# Altium footprint library PcbLib_jp.PcbLib: 255 footprints (part 2 of 16)
Each footprint in its own frame and in the unit in brackets; x right, y up, seen from the top. Pads: shape width x height; smd on the part's side, far side on the other; paste and mask are expansions set on the pad; w line width, h text height; cw(c..) or ccw(c..) is an arc to the next point about the centre after c.
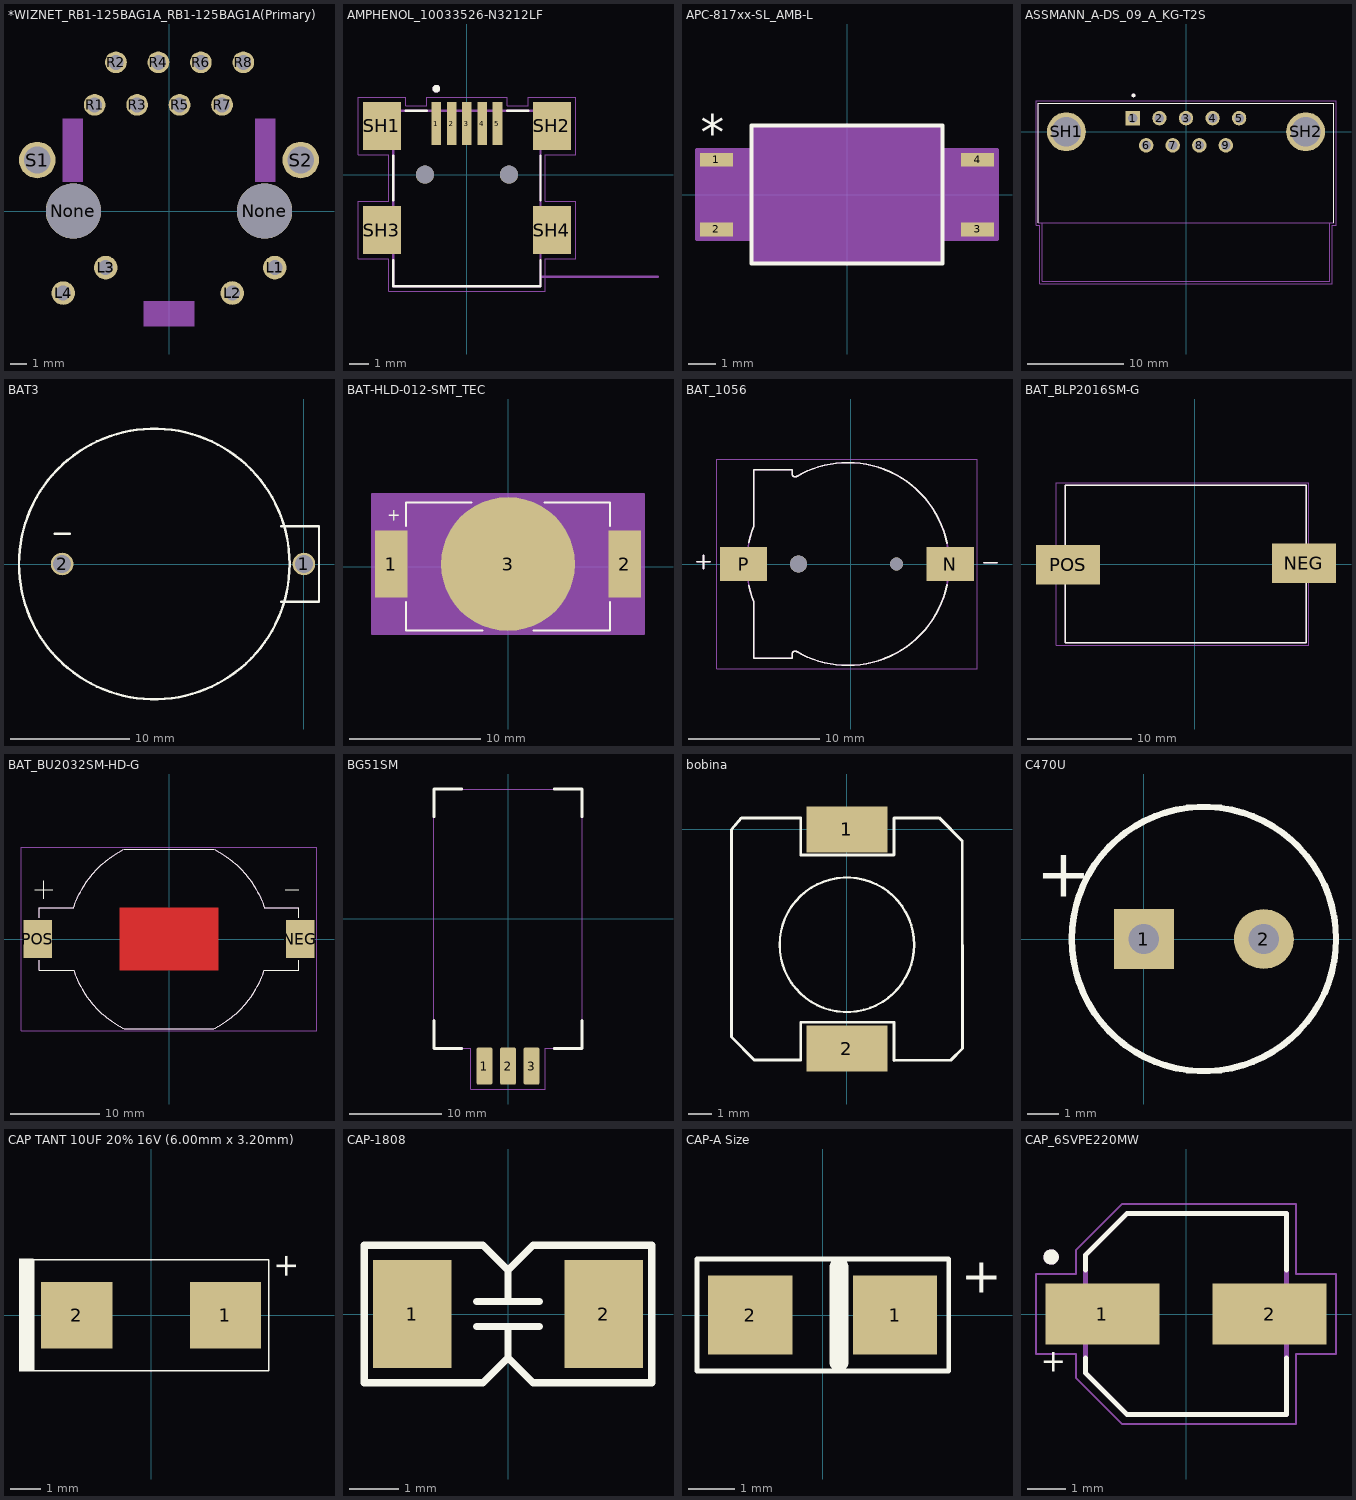
[diagram p1: the footprints below, top view; thin cyan lines are the x and y axes]

## *WIZNET_RB1-125BAG1A_RB1-125BAG1A(Primary) [mm]
pads (16):
  round 1.408 hole 0.9: L1(6.325,-3.38) L2(3.784,-4.899) L3(-3.786,-3.379) L4(-6.325,-4.9)
  round 3.3 hole 3.3 unplated: None(-5.716,-0.001) None(5.714,-0.001)
  round 1.3 hole 0.9: R1(-4.446,6.349) R2(-3.176,8.889) R3(-1.906,6.349) R4(-0.636,8.889) R5(0.634,6.349) R6(1.904,8.889) R7(3.174,6.349) R8(4.444,8.889)
  round 2.184 hole 1.6: S1(-7.876,3.049) S2(7.874,3.049)
Mechanical 13:
  region: -6.36,5.528 -5.15,5.528 -5.15,1.756 -6.36,1.756
  region: 5.156,5.528 6.348,5.528 6.348,1.756 5.156,1.756
  region: -1.5,-5.4 1.5,-5.4 1.5,-6.9 -1.5,-6.9
  region: -6.36,5.528 -5.15,5.528 -5.15,1.756 -6.36,1.756
  region: 5.156,5.528 6.348,5.528 6.348,1.756 5.156,1.756
  region: -1.5,-5.4 1.5,-5.4 1.5,-6.9 -1.5,-6.9

## AMPHENOL_10033526-N3212LF [mm]
height 3.95
pads (11):
  rect 0.5x2.25 smd: 1(-1.6,2.675) 2(-0.8,2.675) 3(0,2.675) 4(0.8,2.675) 5(1.6,2.675)
  rect 2x2.5 smd: SH1(-4.45,2.55) SH2(4.45,2.55) SH3(-4.45,-2.9) SH4(4.45,-2.9)
  round 0.95 hole 0.95 unplated: ""(-2.2,0) ""(2.2,0)
Top Overlay:
  circle w0.2: c-1.6,4.5 r0.1
  lines w0.127: -3.85,-4.47 -3.85,-5.85 3.85,-5.85 3.85,-4.47 ; -3.85,-1.33 -3.85,0.98 ; -3.21,3.35 -2.1,3.35 ; 2.1,3.35 3.21,3.35 ; 3.85,-1.33 3.85,0.98
Mechanical 13:
  circle w0.2: c-1.6,4.5 r0.1
  lines w0.127: 10,-5.34 3.85,-5.34 ; 3.85,-5.34 3.85,-5.85 -3.85,-5.85 -3.85,3.35 3.85,3.35 3.85,-5.34
  text "PCB EDGE" at 4.254,-6.347 h0.8
Mechanical 15:
  lines w0.05: -5.7,-4.4 -5.7,-1.4 -4.1,-1.4 -4.1,1.05 -5.7,1.05 -5.7,4.05 -3.2,4.05 -3.2,3.6 -2.1,3.6 -2.1,4.05 2.1,4.05 2.1,3.6 3.2,3.6 3.2,4.05 5.7,4.05 5.7,1.05 4.1,1.05 4.1,-1.4 5.7,-1.4 5.7,-4.4 4.1,-4.4 4.1,-6.1 -4.1,-6.1 -4.1,-4.4 -5.7,-4.4
3D body "step_temp.STEP": height 3.95, standoff -1.05, extent -4.95,-5.85 4.95,3.47

## APC-817xx-SL_AMB-L [mil]
pads (4):
  rect 48x20 smd paste+0 mask+0: 1(-187.5,50) 2(-187.5,-50) 3(187.5,-50) 4(187.5,50)
Top Overlay:
  lines w6: -137,-99 -137,99 137,99 137,-99 -137,-99
  text "*" at -210,65 h50
Mechanical 13:
  lines w0: -12,94 ccw(c0,94) 12,94
  lines w1: -205.5,-60 -132,-60 -132,-40 -205.5,-40 -205.5,-60 ; -205.5,40 -132,40 -132,60 -205.5,60 -205.5,40 ; -132,-94 -132,94 132,94 132,-94 -132,-94 ; 132,-60 205.5,-60 205.5,-40 132,-40 132,-60 ; 132,40 205.5,40 205.5,60 132,60 132,40
  text "*" at -129.5,41 h50
Mechanical 15:
  region: -136,-64 -215.5,-64 -215.5,64 -136,64 -136,98 136,98 136,64 215.5,64 215.5,-64 136,-64 136,-98 -136,-98
  lines w6: -215.5,-64 -136,-64 -136,-98 136,-98 136,-64 215.5,-64 215.5,64 136,64 136,98 -136,98 -136,64 -215.5,64 -215.5,-64
3D body "APC-817xx-SL_AMB.step": height 150.12, standoff 0, extent -205.51,-94.02 205.51,94.02

## ASSMANN_A-DS_09_A_KG-T2S [mm]
height 12.8
pads (11):
  rect 1.508x1.508 / inner round 1.508 / far side rect 1.508x1.508 hole 1: 1(-5.54,1.42)
  round 1.508 hole 1: 2(-2.77,1.42) 3(0,1.42) 4(2.77,1.42) 5(5.54,1.42) 6(-4.155,-1.42) 7(-1.385,-1.42) 8(1.385,-1.42) 9(4.155,-1.42)
  round 4.066 hole 3.05: SH1(-12.495,0) SH2(12.495,0)
Top Overlay:
  circle w0.2: c-5.48,3.8 r0.1
  lines w0.127: -15.405,-9.5 -15.405,3 15.405,3 15.405,-9.5
Mechanical 13:
  circle w0.2: c-5.48,3.8 r0.1
  lines w0.127: -15,-9.5 -15.405,-9.5 -15.405,3 15.405,3 15.405,-9.5 15,-9.5 ; -15,-9.5 -15,-15.6 15,-15.6 15,-9.5 ; -15,-9.5 15,-9.5
Mechanical 15:
  lines w0.05: -15.655,-9.75 -15.655,3.25 15.655,3.25 15.655,-9.75 15.25,-9.75 15.25,-15.85 -15.25,-15.85 -15.25,-9.75 -15.655,-9.75
3D body "step_temp.STEP": height 12.8, standoff -4.4, extent -15.405,-15.55 15.405,3.05

## BAT3 [mil]
pads (2):
  round 75 / inner round 60 / far side round 75 hole 60 mask+15: 1(0,0) 2(-800,0)
Top Overlay:
  circle w8: c-495,0 r447.8
  lines w8: -825,100 -775,100 ; -75,-125 50,-125 50,125 -75,125
3D body "User Library-20mm_coin_holder.STEP": height 400.39, standoff -78.74, extent -981.75,-451.75 98.22,453.76

## BAT-HLD-012-SMT_TEC [mil]
pads (3):
  rect 98x201 smd paste+0 mask+0: 1(-350.39,7.87) 2(350.39,7.87)
  round 402 smd paste-201 mask-201: 3(0,7.87)
Top Overlay:
  lines w6: -306,-105.73 -306,-192 -76.76,-192 ; -306,121.47 -306,192 -109.24,192 ; 76.76,-192 306,-192 306,-105.73 ; 109.24,192 306,192 306,121.47
  text "+" at -362.99,138.19 h35.43
Mechanical 13:
  circle w20: c-350.39,82.87 r15
  lines w1: -301,-187 301,-187 301,187 -301,187 -301,-187
Mechanical 15:
  region: 409.39,218.87 -409.39,218.87 -409.39,-203.13 409.39,-203.13
  lines w6: -409.39,-203.13 -409.39,218.87 409.39,218.87 409.39,-203.13 -409.39,-203.13
3D body "BAT-HLD-012-SMT.step": height 140, standoff 0, extent -300,-185 300,185

## BAT_1056 [mm]
height 3.99
pads (4):
  rect 3.6x2.6 smd: N(7.61,0) P(-8.18,0)
  round 1.3 hole 1.3 unplated: ""(-3.98,0)
  round 1 hole 1 unplated: ""(3.51,0)
Top Overlay:
  lines w0.127: -11.735,0.16 -10.735,0.16 ; -11.235,-0.34 -11.235,0.66 ; -7.78,-1.632 ccw(c-0.484,-0.082) -7.4,-2.876 ; -7.78,1.632 cw(c-0.484,0.082) -7.4,2.876 ; -7.41,-2.85 -7.41,-7.2 -4.46,-7.2 -4.46,-6.88 ; -7.41,2.85 -7.41,7.2 -4.46,7.2 -4.46,6.88 ; -4.46,-6.881 cw(c-4.255,-6.87) -4.266,-6.665 cw(c-4.248,-7.014) -4.084,-6.705 ; -4.46,6.881 ccw(c-4.255,6.87) -4.266,6.665 ccw(c-4.248,7.014) -4.084,6.705 ; -4.078,-6.709 ccw(c-0.212,-0.013) -0.212,-7.745 ; -4.078,6.709 cw(c-0.212,0.013) -0.212,7.745 ; -0.21,-7.745 ccw(c-0.21,0) 7.366,-1.61 ; -0.21,7.745 cw(c-0.21,0) 7.366,1.61 ; 10.185,0.09 11.185,0.09
Mechanical 13:
  lines w0.127: -11.735,0.16 -10.735,0.16 ; -11.235,-0.34 -11.235,0.66 ; -7.41,-2.85 -7.41,-7.2 -4.46,-7.2 -4.46,-6.88 ; -7.41,2.85 -7.41,7.2 -4.46,7.2 -4.46,6.88 ; -7.393,-2.893 cw(c-0.231,0) -7.393,2.893 ; -4.46,-6.881 cw(c-4.255,-6.87) -4.266,-6.665 cw(c-4.248,-7.014) -4.084,-6.705 ; -4.46,6.881 ccw(c-4.255,6.87) -4.266,6.665 ccw(c-4.248,7.014) -4.084,6.705 ; -4.078,-6.709 ccw(c-0.212,-0.013) -0.212,-7.745 ; -4.078,6.709 cw(c-0.212,0.013) -0.212,7.745 ; -0.21,-7.745 ccw(c-0.21,0) -0.21,7.745 ; 10.185,0.09 11.185,0.09
Mechanical 15:
  lines w0.05: -10.23,-8 -10.23,8 9.66,8 9.66,-8 -10.23,-8
3D body "step_temp.STEP": height 4.33, standoff -0.83, extent -9.478,-7.631 9.322,7.507

## BAT_BLP2016SM-G [mm]
pads (2):
  rect 6.16x3.79 smd: NEG(10.45,0.09) POS(-12.17,-0.06)
Top Overlay:
  lines w0.127: -12.45,-1.8 -12.45,-7.55 10.67,-7.55 10.67,-1.8 ; -12.45,1.8 -12.45,7.55 10.67,7.55 10.67,1.8
  text "-" at 11.43,0 h1.27
  text "+" at -15.24,0 h1.27
Mechanical 13:
  lines w0.127: -12.45,-7.55 10.67,-7.55 10.67,7.55 -12.45,7.55 -12.45,-7.55
  text "-" at 11.43,0 h1.27
  text "+" at -15.24,0 h1.27
Mechanical 15:
  lines w0.05: -13.33,-7.8 -13.33,7.8 10.92,7.8 10.92,-7.8 -13.33,-7.8
3D body "BAT-HLD-010-SMT-TR--3DModel-STEP-56544.STEP": height 5.5, standoff 0, extent -14.4,-8 12.6,8

## BAT_BU2032SM-HD-G [mm]
pads (2):
  rect 3.2x4.2 smd: NEG(14.65,0) POS(-14.65,0)
Top Layer:
  region: 5.5,-3.5 -5.5,-3.5 -5.5,3.5 5.5,3.5
Top Overlay:
  lines w0.127: -15,5.5 -13,5.5 ; -14.5,-2.4 -14.5,-3.5 -10.645,-3.5 -10.581,-3.681 -10.458,-4.024 -10.35,-4.287 -10.242,-4.538 -10.058,-4.937 -9.88,-5.282 -9.7,-5.594 -9.524,-5.892 -9.168,-6.436 -8.897,-6.809 -8.516,-7.277 -8.022,-7.82 -7.774,-8.061 -7.55,-8.273 -7.354,-8.447 -7.193,-8.586 -7,-8.746 -6.779,-8.919 -6.628,-9.03 -6.375,-9.211 -6.049,-9.433 -5.741,-9.619 -5.497,-9.758 -5.166,-9.939 -5.013,-10 ; -14.5,2.4 -14.5,3.5 -10.645,3.5 -10.581,3.681 -10.458,4.024 -10.35,4.287 -10.242,4.538 -10.058,4.937 -9.88,5.282 -9.7,5.594 -9.524,5.892 -9.168,6.436 -8.897,6.809 -8.516,7.277 -8.022,7.82 -7.774,8.061 -7.55,8.273 -7.354,8.447 -7.193,8.586 -7,8.746 -6.779,8.919 -6.628,9.03 -6.375,9.211 -6.049,9.433 -5.741,9.619 -5.497,9.758 -5.166,9.939 -5.013,10 ; -14,4.5 -14,6.5 ; -5,-10 5,-10 ; -5,10 5,10 ; 5.013,-10 5.166,-9.939 5.497,-9.758 5.741,-9.619 6.049,-9.433 6.375,-9.211 6.628,-9.03 6.779,-8.919 7,-8.746 7.193,-8.586 7.354,-8.447 7.55,-8.273 7.774,-8.061 8.022,-7.82 8.516,-7.277 8.897,-6.809 9.168,-6.436 9.524,-5.892 9.7,-5.594 9.88,-5.282 10.058,-4.937 10.242,-4.538 10.35,-4.287 10.458,-4.024 10.581,-3.681 10.645,-3.5 14.5,-3.5 14.5,-2.4 ; 5.013,10 5.166,9.939 5.497,9.758 5.741,9.619 6.049,9.433 6.375,9.211 6.628,9.03 6.779,8.919 7,8.746 7.193,8.586 7.354,8.447 7.55,8.273 7.774,8.061 8.022,7.82 8.516,7.277 8.897,6.809 9.168,6.436 9.524,5.892 9.7,5.594 9.88,5.282 10.058,4.937 10.242,4.538 10.35,4.287 10.458,4.024 10.581,3.681 10.645,3.5 14.5,3.5 14.5,2.4 ; 13,5.5 14.5,5.5
Top Solder:
  region: 5.6,-3.6 -5.6,-3.6 -5.6,3.6 5.6,3.6
Mechanical 13:
  lines w0.127: -14.5,-2.4 -14.5,-3.5 -10.645,-3.5 -10.581,-3.681 -10.458,-4.024 -10.35,-4.287 -10.242,-4.538 -10.058,-4.937 -9.88,-5.282 -9.7,-5.594 -9.524,-5.892 -9.168,-6.436 -8.897,-6.809 -8.516,-7.277 -8.022,-7.82 -7.774,-8.061 -7.55,-8.273 -7.354,-8.447 -7.193,-8.586 -7,-8.746 -6.779,-8.919 -6.628,-9.03 -6.375,-9.211 -6.049,-9.433 -5.741,-9.619 -5.497,-9.758 -5.166,-9.939 -5.013,-10 ; -14.5,2.4 -14.5,3.5 -10.645,3.5 -10.581,3.681 -10.458,4.024 -10.35,4.287 -10.242,4.538 -10.058,4.937 -9.88,5.282 -9.7,5.594 -9.524,5.892 -9.168,6.436 -8.897,6.809 -8.516,7.277 -8.022,7.82 -7.774,8.061 -7.55,8.273 -7.354,8.447 -7.193,8.586 -7,8.746 -6.779,8.919 -6.628,9.03 -6.375,9.211 -6.049,9.433 -5.741,9.619 -5.497,9.758 -5.166,9.939 -5.013,10 ; -5,-10 5,-10 ; -5,10 5,10 ; 5.013,-10 5.166,-9.939 5.497,-9.758 5.741,-9.619 6.049,-9.433 6.375,-9.211 6.628,-9.03 6.779,-8.919 7,-8.746 7.193,-8.586 7.354,-8.447 7.55,-8.273 7.774,-8.061 8.022,-7.82 8.516,-7.277 8.897,-6.809 9.168,-6.436 9.524,-5.892 9.7,-5.594 9.88,-5.282 10.058,-4.937 10.242,-4.538 10.35,-4.287 10.458,-4.024 10.581,-3.681 10.645,-3.5 14.5,-3.5 14.5,-2.4 ; 5.013,10 5.166,9.939 5.497,9.758 5.741,9.619 6.049,9.433 6.375,9.211 6.628,9.03 6.779,8.919 7,8.746 7.193,8.586 7.354,8.447 7.55,8.273 7.774,8.061 8.022,7.82 8.516,7.277 8.897,6.809 9.168,6.436 9.524,5.892 9.7,5.594 9.88,5.282 10.058,4.937 10.242,4.538 10.35,4.287 10.458,4.024 10.581,3.681 10.645,3.5 14.5,3.5 14.5,2.4
Mechanical 15:
  lines w0.05: -16.5,-10.25 16.5,-10.25 16.5,10.25 -16.5,10.25 -16.5,-10.25
3D body "BU2032SM-HD-G--3DModel-STEP-1.STEP": height 5.3, standoff 0, extent -15.99,-10.07 16.01,9.93

## BG51SM [mm] "Nuclear Beta and Gamma Radiation Sensor"
height 7
pads (3):
  rrect20% 1.7x4 smd: 1(-2.54,-15.9) 2(0,-15.9) 3(2.54,-15.9)
Top Overlay:
  lines w0.305: -8,-11 -8,-14 -5,-14 ; -8,11 -8,14 -5,14 ; 5,-14 8,-14 8,-11 ; 5,14 8,14 8,11
Mechanical 15:
  lines w0.051: -8,-14 -8,14 8,14 8,-14 5,-14 4,-14 4,-18.375 -4,-18.375 -4,-14 -5,-14 -8,-14
3D body "BG51.stp": height 7, standoff 0, extent -8,-17.5 8,14

## bobina [mil]
pads (2):
  rect 137.8x78.73 smd: 1(0,0) 2(0,-374)
Top Overlay:
  circle w3.93: c0,-196.85 r114.77
  lines w5: -196.83,-354.32 -196.83,0 -180,19.67 -78.73,19.67 -78.73,-44 80,-44 80,19.67 157.47,19.67 196.83,-19.7 197.15,-373.68 177.15,-393.68 80,-394 80,-329 -78.73,-329 -78.73,-393.68 -157.47,-393.68 -196.83,-354.32
3D body "Coilcraft-MSS1038.STEP": height 212.6, standoff 55.12, extent -197.79,-390.75 203.79,14.76

## C470U [mil]
pads (2):
  rect 75x75 / inner round 75 / far side round 75 hole 38: 1(0,0)
  round 75 / inner round 60 / far side round 75 hole 38: 2(150,0)
Top Overlay:
  circle w8: c75,0 r165.3
  text "+" at -135,53 h60
3D body "CircuitWorks-ELECTROLITIC CAPACITOR RADIAL 8X12.STEP": height 476.38, standoff -94.49, extent -82.48,-157.47 232.49,157.49

## CAP TANT 10UF 20% 16V (6.00mm x 3.20mm) [mm]
pads (2):
  rect 2.37x2.21 smd: 1(2.475,0) 2(-2.475,0)
Top Overlay:
  rectangle: -4.394,-1.88 -3.91,1.88
  lines w0.05: -3.91,-1.85 -3.91,1.85 ; -3.91,-1.85 3.91,-1.85 3.91,1.85 -3.91,1.85 ; -3.91,-1.85 -3.91,1.85
  text "-" at -3.785,1.194 h0.76
  text "+" at 4.826,1.194 h0.76
3D body: height 0.25, standoff -15.2, extent -1.321,0.406 -1.321,0.406
3D body: height 0.25, standoff -15.2, extent 5.258,0.178 5.258,0.178
3D body "t491c106m016at.stp": height 2.81, standoff 0.01, extent -3.023,-1.824 3.277,1.676

## CAP-1808 [mm] "Ceramic CAP 1808(4520)"
height 3.9
pads (2):
  rect 1.6x2.2 smd: 1(-1.95,0) 2(1.95,0)
Top Overlay:
  lines w0.15: -0.635,-0.254 0.635,-0.254 ; -0.635,0.254 0.635,0.254 ; 0,-0.254 0,-0.889 ; 0,0.254 0,0.889 ; 0,-0.889 0.508,-1.397 2.921,-1.397 2.921,1.397 0.508,1.397 0.127,1.016 0,0.889 ; 0,-0.889 -0.508,-1.397 -2.921,-1.397 -2.921,1.397 -0.508,1.397 0,0.889
3D body "User Library-Chip Cap_MLCC_1808 (4520)_K.STEP": height 2, standoff 0, extent -2.25,-1.016 2.25,1.014

## CAP-A Size [mm] "Tantal CAP A Size EIA/IECQ 3216"
height 2.5
pads (2):
  rect 1.8x1.7 smd: 1(1.55,0) 2(-1.55,0)
Top Overlay:
  lines w0.1: -2.69,0.2 -2.69,-1.2 2.7,-1.2 2.7,1.2 -2.69,1.2 -2.69,0.22
  lines w0.4: 0.35,-1.01 0.35,1.03
  text "+" at 2.972,0.483 h0.76
3D body "User Library-Tantalum Capacitor Case A.STEP": height 1.75, standoff 0.1, extent -1.495,-0.83 1.895,0.77

## CAP_6SVPE220MW [mm]
pads (2):
  rect 3x1.6 smd: 1(-2.2,0) 2(2.2,0)
Top Overlay:
  circle w0.2: c-3.55,1.5 r0.1
  lines w0.127: -2.65,-1.15 -2.65,-1.55 -1.55,-2.65 2.65,-2.65 2.65,-1.15 ; -2.65,1.15 -2.65,1.55 -1.55,2.65 2.65,2.65 2.65,1.15
  text "+" at -3.83,-1.72 h1
Mechanical 13:
  circle w0.2: c-3.55,1.5 r0.1
  lines w0.127: -2.65,-1.55 -2.65,1.55 -1.55,2.65 2.65,2.65 2.65,-2.65 -1.55,-2.65 -2.65,-1.55
Mechanical 15:
  lines w0.05: -3.95,-1.05 -3.95,1.05 -2.9,1.05 -2.9,1.675 -1.675,2.9 2.9,2.9 2.9,1.05 3.95,1.05 3.95,-1.05 2.9,-1.05 2.9,-2.9 -1.675,-2.9 -2.9,-1.675 -2.9,-1.05 -3.95,-1.05
3D body "6SVPE220MW.STEP": height 5.9, standoff 0, extent -2.96,-2.61 3.04,2.69
3D body: height 4.32, standoff -4.32, extent -3.57,1.68 -3.57,1.68
3D body: height 4.32, standoff -4.32, extent -3.59,1.56 -3.59,1.56
3D body: height 4.32, standoff -4.32, extent -3.53,1.48 -3.53,1.48
3D body: height 4.32, standoff -4.32, extent -3.82,2.12 -3.82,2.12
3D body: height 4.32, standoff -4.32, extent -3.44,1.74 -3.44,1.74
3D body: height 4.32, standoff -4.32, extent -3.44,1.56 -3.44,1.56